# Altium footprint library Connectors.PcbLib: 97 footprints (part 6 of 7)
Each footprint in its own frame and in the unit in brackets; x right, y up, seen from the top. Pads: shape width x height; smd on the part's side, far side on the other; paste and mask are expansions set on the pad; w line width, h text height; cw(c..) or ccw(c..) is an arc to the next point about the centre after c.
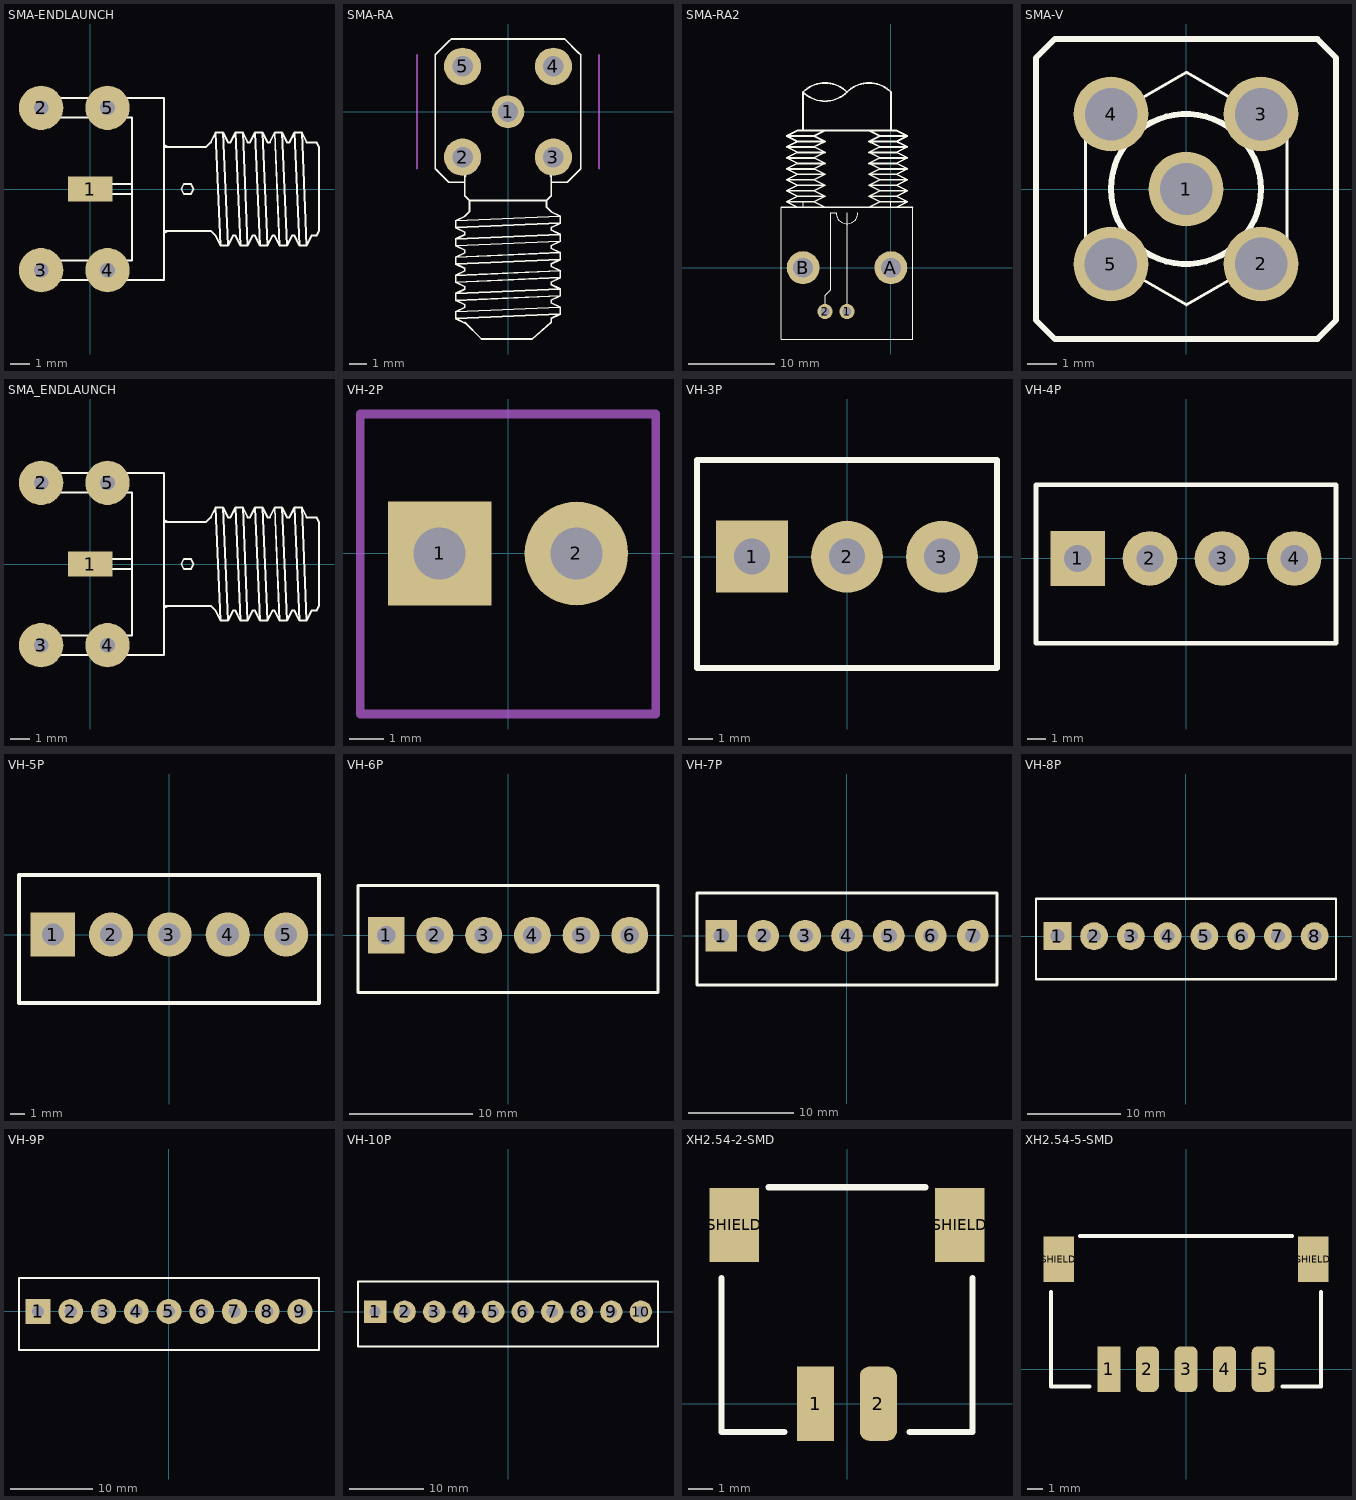
[diagram p5: the footprints below, top view; thin cyan lines are the x and y axes]

## SMA-ENDLAUNCH [mil]
pads (5):
  rect 90x50 smd: 1(0,0)
  round 90 hole 30: 2(-100,165) 3(-100,-165) 4(35,-165) 5(35,165)
Top Overlay:
  lines w4: 10,-10 85,-10 ; 10,10 85,10 ; 150,-90 160,-85 ; 150,-85 200,-85 220,-85 225,-85 235,-85 245,-85 255,-95 265,-115 ; 150,85 200,85 220,85 225,85 235,85 245,95 255,115 ; 150,90 160,85 ; 255,115 265,-115 ; 255,115 270,115 ; 265,-115 280,-115 ; 270,115 280,-115 ; 270,115 280,95 285,95 ; 280,-115 290,-95 ; 285,95 295,115 ; 285,95 295,115 ; 290,-95 295,-95 ; 290,-95 295,-95 ; 295,-95 305,-115 ; 295,115 305,-115 ; 295,115 310,115 ; 305,-115 320,-115 ; 310,115 320,-115 ; 310,115 320,95 325,95 335,115 ; 320,-115 330,-95 335,-95 345,-115 ; 335,115 345,-115 ; 335,115 350,115 ; 345,-115 360,-115 ; 350,115 360,-115 ; 350,115 360,95 365,95 375,115 ; 360,-115 370,-95 375,-95 385,-115 ; 375,115 385,-115 ; 375,115 390,115 ; 385,-115 400,-115 ; 390,115 400,-115 ; 390,115 400,95 405,95 415,115 ; 400,-115 410,-95 415,-95 425,-115 ; 415,115 425,-115 ; 415,115 430,115 ; 425,-115 440,-115 ; 430,115 440,-115 ; 430,115 440,95 448.33,95 460,95 465,85 465,53.33 465,-58.33 465,-85 460,-95 450,-95 440,-115 ; -100,-185 150,-185 150,185 85,185 65,185 -100,185 -100,145 85,145 85,-145 -100,-145 -100,-185 ; 185,0 190,-10 205,-10 210,0 205,10 190,10 185,0
3D body "sma-endlaunch.step": height 140, standoff -110, extent -126.5,-120 470.5,130

## SMA-RA [mil]
pads (5):
  round 72 hole 45: 1(0,0)
  round 82 hole 45: 2(-100,-100) 3(100,-100) 4(100,100) 5(-100,100)
Top Overlay:
  lines w4: -155,-130 -160,-125 ; -95,-465 -115,-455 ; -95,-463.33 -58.33,-500 53.33,-500 95,-463.33 95,-455 115,-445 ; -95,-155 -130,-155 -160,-125 ; -93.33,-141.67 -95,-140 -95,-185 -85,-195 ; 93.33,-141.67 95,-140 95,-185 85,-195 ; 95,-155 130,-155 160,-125 160,80 ; 160,75 160,125 155,130 125,160 -125,160 -130,155 -160,125 -160,-125 ; -115,-455 115,-445 ; -115,-455 -115,-440 ; -115,-440 115,-430 ; -115,-440 -95,-430 -95,-425 -115,-415 ; -115,-415 115,-405 ; -115,-415 -115,-400 ; -115,-400 115,-390 ; -115,-400 -95,-390 -95,-385 -115,-375 ; -115,-375 115,-365 ; -115,-375 -115,-360 ; -115,-360 115,-350 ; -115,-360 -95,-350 -95,-345 -115,-335 ; -115,-335 115,-325 ; -115,-335 -115,-320 ; -115,-320 115,-310 ; -115,-320 -95,-310 -95,-305 -115,-295 ; -115,-295 115,-285 ; -115,-295 -115,-280 ; -115,-280 115,-270 ; -115,-280 -95,-270 -95,-265 -115,-255 ; -115,-255 115,-245 ; -115,-255 -115,-240 ; -115,-240 115,-230 ; -115,-240 -95,-230 -85,-220 -85,-210 -85,-200 -85,-195 ; -85,-195 85,-195 ; 85,-195 85,-200 85,-210 95,-220 115,-230 ; 115,-445 115,-430 ; 115,-430 95,-420 95,-415 115,-405 ; 115,-405 115,-390 ; 115,-390 95,-380 95,-375 115,-365 ; 115,-365 115,-350 ; 115,-350 95,-340 95,-335 115,-325 ; 115,-325 115,-310 ; 115,-310 95,-300 95,-295 115,-285 ; 115,-285 115,-270 ; 115,-270 95,-260 95,-255 115,-245 ; 115,-245 115,-230
Mechanical 1:
  lines w4: -200,-125 -200,125 ; 200,-125 200,125
3D body "SMA-J-P-X-RA-TH1.step": height 394.06, standoff -149.25, extent -136.5,-457.49 139.09,137

## SMA-RA2 [mil]
pads (4):
  round 70 hole 40: 1(-200,-200) 2(-300,-200)
  round 150 hole 90: A(0,0) B(-400,0)
Top Overlay:
  lines w4: -400,275 -400,300 ; -325,275 100,275 ; -300,-200 -300,-125 -275,-100 -275,250 -250,250 ccw(c-200,250) -150,250 ; -300,275 -500,275 -500,25 -500,-325 100,-325 100,275 ; -200,-200 -200,200 -200,250 -200,225 ; 0,275 0,300 ; 100,-225 100,275
  lines w8: -500,275 100,275 ; -425,275 -475,300 ; -400.17,799.83 ccw(c-300,900) -199.83,799.83 ; -400.17,800.17 cw(c-300,700) -199.83,800.17 ; -400,625 -400,800 ; -300,275 -350,300 ; -200.17,800.17 cw(c-100,700) 0.17,800.17 ; -100,275 -50,300 ; 0,625 0,800 ; 25,275 75,300 ; -475,300 -425,325 ; -475,300 -350,300 ; -475,350 -425,325 ; -475,350 -425,375 ; -475,350 -350,350 ; -475,400 -425,375 ; -475,400 -425,425 ; -475,400 -350,400 ; -475,450 -425,425 ; -475,450 -425,475 ; -475,450 -350,450 ; -475,500 -425,475 ; -475,500 -425,525 ; -475,500 -350,500 ; -475,550 -425,525 ; -475,550 -425,575 ; -475,550 -350,550 ; -475,600 -425,575 ; -475,600 -425,625 ; -475,600 -350,600 ; -425,325 -300,325 ; -425,375 -300,375 ; -425,425 -300,425 ; -425,475 -300,475 ; -425,525 -300,525 ; -425,575 -300,575 ; -425,625 25,625 ; -425,625 -300,625 -350,600 ; -350,300 -300,325 ; -350,350 -300,325 ; -350,350 -300,375 ; -350,400 -300,375 ; -350,400 -300,425 ; -350,450 -300,425 ; -350,450 -300,475 ; -350,500 -300,475 ; -350,500 -300,525 ; -350,550 -300,525 ; -350,550 -300,575 ; -350,600 -300,575 ; -100,325 -50,300 ; -100,325 -50,350 ; -100,325 25,325 ; -100,375 -50,350 ; -100,375 -50,400 ; -100,375 25,375 ; -100,425 -50,400 ; -100,425 -50,450 ; -100,425 25,425 ; -100,475 -50,450 ; -100,475 -50,500 ; -100,475 25,475 ; -100,525 -50,500 ; -100,525 -50,550 ; -100,525 25,525 ; -100,575 -50,550 ; -100,575 -50,600 ; -100,575 25,575 ; -50,300 75,300 ; -50,350 75,350 ; -50,400 75,400 ; -50,450 75,450 ; -50,500 75,500 ; -50,550 75,550 ; -50,600 -100,625 25,625 ; -50,600 75,600 ; 25,325 75,300 ; 25,325 75,350 ; 25,375 75,350 ; 25,375 75,400 ; 25,425 75,400 ; 25,425 75,450 ; 25,475 75,450 ; 25,475 75,500 ; 25,525 75,500 ; 25,525 75,550 ; 25,575 75,550 ; 25,575 75,600 ; 25,625 75,600
3D body "bnc 3.STEP": height 619.21, standoff -168.19, extent -490.55,-265.59 90.56,1141.89

## SMA-V [mil]
pads (5):
  round 100 hole 70: 1(0,0) 2(100,-100) 3(100,100) 4(-100,100) 5(-100,-100)
Top Overlay:
  circle w8: c0,0 r100
  circle w8: c0,0 r25
  lines w4: -133.69,-76.91 -133.69,78.09 0.55,155.59 134.78,78.09 134.78,-76.91 0.55,-154.41 -133.69,-76.91
  lines w8: -200,-175 -175,-200 175,-200 200,-175 200,175 175,200 -175,200 -200,175 -200,150 -200,-175
3D body "SMA-J-P-X-ST-TH1.step": height 385.54, standoff -145.95, extent -138.3,-136.09 137.3,139.5

## SMA_ENDLAUNCH [mil]
pads (5):
  rect 90x50 smd: 1(0,0)
  round 90 hole 30: 2(-100,165) 3(-100,-165) 4(35,-165) 5(35,165)
Top Overlay:
  lines w4: 10,-10 85,-10 ; 10,10 85,10 ; 150,-90 160,-85 ; 150,-85 200,-85 220,-85 225,-85 235,-85 245,-85 255,-95 265,-115 ; 150,85 200,85 220,85 225,85 235,85 245,95 255,115 ; 150,90 160,85 ; 255,115 265,-115 ; 255,115 270,115 ; 265,-115 280,-115 ; 270,115 280,-115 ; 270,115 280,95 285,95 ; 280,-115 290,-95 ; 285,95 295,115 ; 285,95 295,115 ; 290,-95 295,-95 ; 290,-95 295,-95 ; 295,-95 305,-115 ; 295,115 305,-115 ; 295,115 310,115 ; 305,-115 320,-115 ; 310,115 320,-115 ; 310,115 320,95 325,95 335,115 ; 320,-115 330,-95 335,-95 345,-115 ; 335,115 345,-115 ; 335,115 350,115 ; 345,-115 360,-115 ; 350,115 360,-115 ; 350,115 360,95 365,95 375,115 ; 360,-115 370,-95 375,-95 385,-115 ; 375,115 385,-115 ; 375,115 390,115 ; 385,-115 400,-115 ; 390,115 400,-115 ; 390,115 400,95 405,95 415,115 ; 400,-115 410,-95 415,-95 425,-115 ; 415,115 425,-115 ; 415,115 430,115 ; 425,-115 440,-115 ; 430,115 440,-115 ; 430,115 440,95 448.33,95 460,95 465,85 465,53.33 465,-58.33 465,-85 460,-95 450,-95 440,-115 ; -100,-185 150,-185 150,185 85,185 65,185 -100,185 -100,145 85,145 85,-145 -100,-145 -100,-185 ; 185,0 190,-10 205,-10 210,0 205,10 190,10 185,0
3D body "sma-endlaunch-wide.step": height 155.91, standoff -155.91, extent -103.24,-186 441.24,188.8

## VH-2P [mm] "B2P-VH"
pads (2):
  rect 3x3 hole 1.5: 1(-1.98,0)
  round 3 hole 1.5: 2(1.98,0)
Mechanical 1:
  lines w0.254: -4.278,-4.648 4.278,-4.648 4.278,4.039 -4.278,4.039 -4.278,-4.648
3D body "JST - VH - Thru (V) - 2Pin - 3.96mm.stp": height 10.36, standoff -3.96, extent -4.278,-4.648 4.278,4.039

## VH-3P [mm] "B3P-VH"
pads (3):
  rect 3x3 hole 1.5: 1(-3.96,0)
  round 3 hole 1.5: 2(0,0) 3(3.96,0)
Top Overlay:
  lines w0.254: -6.258,-4.648 6.258,-4.648 6.258,4.039 -6.258,4.039 -6.258,-4.648
3D body "JST - VH - Thru (V) - 3Pin - 3.96mm.stp": height 10.36, standoff -3.96, extent -6.258,-4.648 6.258,4.039

## VH-4P [mm] "B4P-VH"
pads (4):
  rect 3x3 hole 1.5: 1(-5.94,0)
  round 3 hole 1.5: 2(-1.98,0) 3(1.98,0) 4(5.94,0)
Top Overlay:
  lines w0.254: -8.238,-4.648 8.238,-4.648 8.238,4.039 -8.238,4.039 -8.238,-4.648
3D body "JST - VH - Thru (V) - 4Pin - 3.96mm.stp": height 10.36, standoff -3.96, extent -8.238,-4.648 8.238,4.039

## VH-5P [mm] "B5P-VH"
pads (5):
  rect 3x3 hole 1.5: 1(-7.92,0)
  round 3 hole 1.5: 2(-3.96,0) 3(0,0) 4(3.96,0) 5(7.92,0)
Top Overlay:
  lines w0.254: -10.218,-4.648 10.16,-4.648 10.16,4.039 -10.218,4.039 -10.218,-4.648
3D body "JST - VH - Thru (V) - 5Pin - 3.96mm.stp": height 10.36, standoff -3.96, extent -10.218,-4.648 10.218,4.039

## VH-6P [mm] "B6P-VH"
pads (6):
  rect 3x3 hole 1.5: 1(-9.9,0)
  round 3 hole 1.5: 2(-5.94,0) 3(-1.98,0) 4(1.98,0) 5(5.94,0) 6(9.9,0)
Top Overlay:
  lines w0.254: -12.198,-4.648 12.198,-4.648 12.198,4.039 -12.198,4.039 -12.198,-4.648
3D body "JST - VH - Thru (V) - 6Pin - 3.96mm.stp": height 10.36, standoff -3.96, extent -12.198,-4.648 12.198,4.039

## VH-7P [mm] "B7P-VH"
pads (7):
  rect 3x3 hole 1.5: 1(-11.88,0)
  round 3 hole 1.5: 2(-7.92,0) 3(-3.96,0) 4(0,0) 5(3.96,0) 6(7.92,0) 7(11.88,0)
Top Overlay:
  lines w0.254: -14.178,-4.648 -14.178,4.039 14.178,4.039 14.178,-4.648 -14.178,-4.648
3D body "JST - VH - Thru (V) - 7Pin - 3.96mm.stp": height 10.36, standoff -3.96, extent -14.178,-4.648 14.178,4.039

## VH-8P [mm] "B8P-VH"
pads (8):
  rect 3x3 hole 1.5: 1(-13.86,0)
  round 3 hole 1.5: 2(-9.9,0) 3(-5.94,0) 4(-1.98,0) 5(1.98,0) 6(5.94,0) 7(9.9,0) 8(13.86,0)
Top Overlay:
  lines w0.254: -16.158,-4.648 16.158,-4.648 16.158,4.039 -16.158,4.039 -16.158,-4.648
3D body "JST - VH - Thru (V) - 8Pin - 3.96mm.stp": height 10.36, standoff -3.96, extent -16.158,-4.648 16.158,4.039

## VH-9P [mm] "B9P-VH"
pads (9):
  rect 3x3 hole 1.5: 1(-15.84,0)
  round 3 hole 1.5: 2(-11.88,0) 3(-7.92,0) 4(-3.96,0) 5(0,0) 6(3.96,0) 7(7.92,0) 8(11.88,0) 9(15.84,0)
Top Overlay:
  lines w0.254: -18.138,-4.648 18.138,-4.648 18.138,4.039 -18.138,4.039 -18.138,-4.648
3D body "JST - VH - Thru (V) - 9Pin - 3.96mm.stp": height 10.36, standoff -3.96, extent -18.138,-4.648 18.138,4.039

## VH-10P [mm] "B10P-VH"
pads (10):
  rect 3x3 hole 1.5: 1(-17.82,0)
  round 3 hole 1.5: 2(-13.86,0) 3(-9.9,0) 4(-5.94,0) 5(-1.98,0) 6(1.98,0) 7(5.94,0) 8(9.9,0) 9(13.86,0) 10(17.82,0)
Top Overlay:
  lines w0.254: -20.118,-4.648 20.118,-4.648 20.118,4.039 -20.118,4.039 -20.118,-4.648
3D body "JST - VH - Thru (V) - 10Pin - 3.96mm.stp": height 10.36, standoff -3.96, extent -20.118,-4.648 20.118,4.039

## XH2.54-2-SMD [mm] "CON2"
height 5.08
pads (4):
  rect 1.5x3 smd: 1(-1.27,0)
  rrect50% 1.5x3 smd: 2(1.27,0)
  rect 2x3 smd: SHIELD(-4.572,7.239) SHIELD(4.572,7.239)
Top Overlay:
  lines w0.254: -5.08,5.08 -5.08,-1.143 -2.54,-1.143 ; 2.54,-1.143 5.08,-1.143 5.08,5.08 ; -3.175,8.763 3.175,8.763 -3.175,8.763
3D body "JST - XH - SMD R - 2Pin - 2.54mm.stp": height 5.92, standoff 0, extent -5.067,-1.143 5.067,8.763

## XH2.54-5-SMD [mm] "CON5"
height 5.08
pads (7):
  rect 1.5x3 smd: 1(-5.08,0)
  rrect50% 1.5x3 smd: 2(-2.54,0) 3(0,0) 4(2.54,0) 5(5.08,0)
  rect 2x3 smd: SHIELD(-8.382,7.239) SHIELD(8.382,7.239)
Top Overlay:
  lines w0.254: -8.89,5.08 -8.89,-1.143 -6.35,-1.143 ; -6.985,8.763 6.985,8.763 ; 6.35,-1.143 8.89,-1.143 8.89,5.08
3D body "JST - XH - SMD R - 5Pin - 2.54mm.stp": height 5.92, standoff 0, extent -8.877,-1.143 8.877,8.763